# Altium footprint library self_pcblib v1.8.6.PcbLib: 164 footprints (part 3 of 11)
Each footprint in its own frame and in the unit in brackets; x right, y up, seen from the top. Pads: shape width x height; smd on the part's side, far side on the other; paste and mask are expansions set on the pad; w line width, h text height; cw(c..) or ccw(c..) is an arc to the next point about the centre after c.
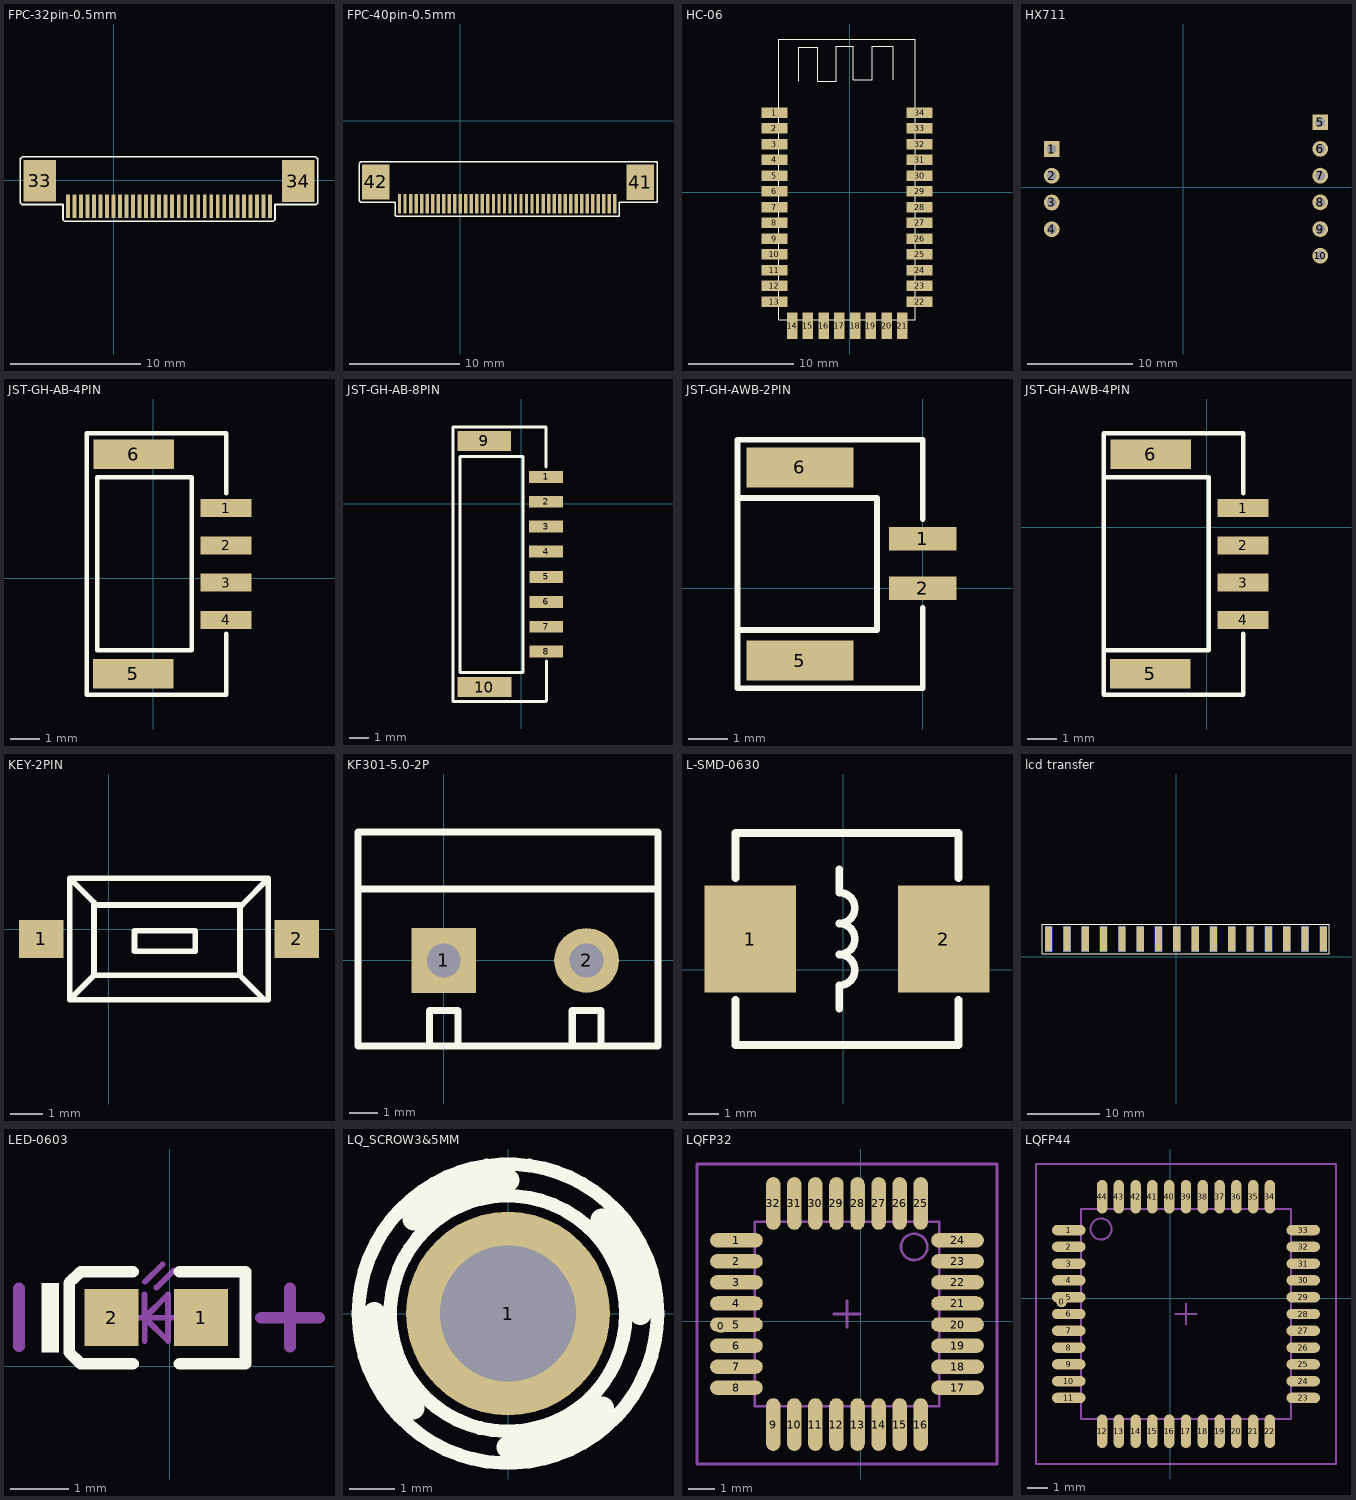
[diagram p2: the footprints below, top view; thin cyan lines are the x and y axes]

## FPC-32pin-0.5mm [mm]
pads (34):
  rect 0.3x1.8 smd: 1(-3.5,-2) 2(-3,-2) 3(-2.5,-2) 4(-2,-2) 5(-1.5,-2) 6(-1,-2) 7(-0.5,-2) 8(0,-2) 9(0.5,-2) 10(1,-2) 11(1.5,-2) 12(2,-2) 13(2.5,-2) 14(3,-2) 15(3.5,-2) 16(4,-2) 17(4.5,-2) 18(5,-2) 19(5.5,-2) 20(6,-2) 21(6.5,-2) 22(7,-2) 23(7.5,-2) 24(8,-2) 25(8.5,-2) 26(9,-2) 27(9.5,-2) 28(10,-2) 29(10.5,-2) 30(11,-2) 31(11.5,-2) 32(12,-2)
  rect 2.5x3.2 smd: 33(-5.664,-0.025) 34(14.173,-0.051)
Top Overlay:
  lines w0.127: -7.163,1.6 -7.163,-1.727 -7.036,-1.854 -3.886,-1.854 -3.886,-3.023 -3.785,-3.124 12.268,-3.124 12.395,-2.997 12.395,-1.854 13.97,-1.854 15.57,-1.854 15.672,-1.753 15.672,1.651 15.519,1.803 -7.01,1.803 -7.163,1.651
3D body "70801.stp": height 2, standoff -0.05, extent -6.5,-2.3 15,3.3

## FPC-40pin-0.5mm [mm]
pads (42):
  rect 0.3x1.8 smd: 1(-5.5,-7.5) 2(-5,-7.5) 3(-4.5,-7.5) 4(-4,-7.5) 5(-3.5,-7.5) 6(-3,-7.5) 7(-2.5,-7.5) 8(-2,-7.5) 9(-1.5,-7.5) 10(-1,-7.5) 11(-0.5,-7.5) 12(0,-7.5) 13(0.5,-7.5) 14(1,-7.5) 15(1.5,-7.5) 16(2,-7.5) 17(2.5,-7.5) 18(3,-7.5) 19(3.5,-7.5) 20(4,-7.5) 21(4.5,-7.5) 22(5,-7.5) 23(5.5,-7.5) 24(6,-7.5) 25(6.5,-7.5) 26(7,-7.5) 27(7.5,-7.5) 28(8,-7.5) 29(8.5,-7.5) 30(9,-7.5) 31(9.5,-7.5) 32(10,-7.5) 33(10.5,-7.5) 34(11,-7.5) 35(11.5,-7.5) 36(12,-7.5) 37(12.5,-7.5) 38(13,-7.5) 39(13.5,-7.5) 40(14,-7.5)
  rect 2.5x3.2 smd: 41(16.307,-5.537) 42(-7.664,-5.525)
Top Overlay:
  lines w0.127: -9.163,-3.9 -9.163,-7.227 -9.036,-7.354 -5.886,-7.354 -5.886,-8.523 -5.785,-8.624 14.376,-8.624 14.376,-7.354 17.831,-7.354 17.831,-3.697 -9.01,-3.697 -9.163,-3.849
3D body "4-1734592-0.stp": height 2, standoff -0.05, extent -8.448,-8.001 16.982,-2.891

## HC-06 [mm]
pads (34):
  rect 2.5x1 smd: 1(-7.171,7.604) 2(-7.171,6.104) 3(-7.171,4.604) 4(-7.171,3.104) 5(-7.171,1.604) 6(-7.171,0.104) 7(-7.171,-1.396) 8(-7.171,-2.896) 9(-7.171,-4.396) 10(-7.171,-5.896) 11(-7.171,-7.396) 12(-7.171,-8.896) 13(-7.171,-10.396) 22(6.629,-10.396) 23(6.629,-8.896) 24(6.629,-7.396) 25(6.629,-5.896) 26(6.629,-4.396) 27(6.629,-2.896) 28(6.629,-1.396) 29(6.629,0.104) 30(6.629,1.604) 31(6.629,3.104) 32(6.629,4.604) 33(6.629,6.104) 34(6.629,7.604)
  rect 1x2.5 smd: 14(-5.496,-12.696) 15(-3.996,-12.696) 16(-2.496,-12.696) 17(-0.996,-12.696) 18(0.504,-12.696) 19(2.004,-12.696) 20(3.504,-12.696) 21(5.004,-12.696)
Top Overlay:
  lines w0.1: -4.871,10.604 -4.871,13.804 -3.071,13.804 -3.071,10.604 -1.271,10.604 -1.271,13.904 0.329,13.904 0.329,10.704 2.129,10.704 2.129,13.904 4.129,13.904 4.129,10.704 ; -6.771,-12.096 6.229,-12.096 6.229,14.604 -6.771,14.604 -6.771,-12.096
3D body "Bluetooth HC-06_.step": height 0, standoff -2.35, extent -7.271,-12.201 6.749,15.809

## HX711 [mm]
pads (10):
  rect 1.5x1.5 hole 0.9: 1(-12.5,3.61) 5(13,6.16)
  round 1.5 hole 0.9: 2(-12.5,1.07) 3(-12.5,-1.47) 4(-12.5,-4.01) 6(13,3.62) 7(13,1.08) 8(13,-1.46) 9(13,-4) 10(13,-6.54)
Bottom Overlay:
  lines w0.127: -14,-8.69 14.5,-8.69 14.5,8.31 -14,8.31 -14,-8.69

## JST-GH-AB-4PIN [mm] "立贴"
pads (6):
  rect 1.7x0.6 smd: 1(2.444,2.352) 2(2.444,1.102) 3(2.444,-0.148) 4(2.444,-1.398)
  rect 2.7x1 smd: 5(-0.66,-3.2) 6(-0.656,4.152)
Top Overlay:
  lines w0.15: 2.444,-1.854 2.444,-3.912 -2.231,-3.912 -2.231,4.852 2.444,4.852 2.444,2.852 ; -1.878,-2.413 1.294,-2.413 1.294,3.377 -1.878,3.377 -1.878,-2.413

## JST-GH-AB-8PIN [mm] "立贴"
pads (10):
  rect 1.7x0.6 smd: 1(1.237,1.348) 2(1.237,0.098) 3(1.237,-1.152) 4(1.237,-2.402) 5(1.249,-3.669) 6(1.249,-4.919) 7(1.249,-6.169) 8(1.249,-7.419)
  rect 2.7x1 smd: 9(-1.863,3.148) 10(-1.854,-9.195)
Top Overlay:
  lines w0.15: 1.237,-9.906 -3.438,-9.906 -3.438,3.848 1.237,3.848 1.237,1.848 ; 1.27,-9.887 1.27,-7.887 ; -3.085,-8.458 -3.085,2.373 0.087,2.373 0.087,-8.458 -3.085,-8.458

## JST-GH-AWB-2PIN [mm] "卧贴"
pads (4):
  rect 1.7x0.6 smd: 1(0,1.25) 2(0,0)
  rect 2.7x1 smd: 5(-3.1,-1.825) 6(-3.1,3.05)
Top Overlay:
  lines w0.15: -4.675,2.275 -1.15,2.275 -1.15,-1.05 -2.019,-1.05 -3.756,-1.05 -4.625,-1.05 ; 0,-0.5 0,-2.525 -4.675,-2.525 -4.675,3.75 0,3.75 0,1.75

## JST-GH-AWB-4PIN [mm] "卧贴"
pads (6):
  rect 1.7x0.6 smd: 1(1.225,0.65) 2(1.225,-0.6) 3(1.225,-1.85) 4(1.225,-3.1)
  rect 2.7x1 smd: 5(-1.88,-4.902) 6(-1.875,2.45)
Top Overlay:
  lines w0.15: -3.45,1.675 0.075,1.675 0.075,-4.115 -3.426,-4.115 ; 1.225,-3.556 1.225,-5.613 -3.45,-5.613 -3.45,3.15 1.225,3.15 1.225,1.15
3D body "User Library-SM04B-GHS-TB.STEP": height 4.25, standoff -0.1, extent -3.314,-5.359 1.536,2.891

## KEY-2PIN [mm]
pads (2):
  rect 1.4x1.2 smd: 1(-2.119,-0.305) 2(5.881,-0.305)
Top Overlay:
  lines w0.178: -0.468,0.838 -0.468,-1.443 ; 4.104,0.699 4.104,-1.448 ; 4.993,1.595 -1.23,1.595 ; -1.23,-2.205 -0.468,-1.443 ; -1.23,-2.205 4.993,-2.205 ; -1.23,-2.205 -1.23,1.595 ; -1.23,1.595 -1.225,1.595 -0.392,0.762 4.167,0.762 4.993,1.588 4.993,-2.205 ; -0.468,-1.443 4.099,-1.443 4.104,-1.448 ; 4.104,-1.448 4.861,-2.205 4.993,-2.205 ; 0.802,-0.686 2.707,-0.686 2.707,-0.051 0.802,-0.051 0.802,-0.686
3D body "按键.STEP": height 1.9, standoff 0, extent -1.42,-1.905 5.18,1.295

## KF301-5.0-2P [mm] "可拼接端子/6A"
pads (2):
  rect 2.3x2.3 hole 1.2: 1(0,0)
  round 2.3 hole 1.2: 2(5.08,0)
Top Overlay:
  lines w0.254: -3.048,2.54 7.62,2.54 ; -0.508,-3.048 -0.508,-1.778 0.508,-1.778 0.508,-3.048 ; 4.572,-3.048 4.572,-1.778 5.588,-1.778 5.588,-3.048 ; -3.048,-3.048 7.62,-3.048 7.62,4.572 -3.048,4.572 -3.048,-3.048
3D body "KF301-5.0.STEP": height 10.05, standoff -3.75, extent 2.003,-3.089 7.503,4.511
3D body "KF301-5.0.STEP": height 10.05, standoff -3.75, extent -2.997,-3.089 2.503,4.511

## L-SMD-0630 [mm] "电感"
pads (2):
  rect 3x3.5 smd: 1(-3.048,1.016) 2(3.302,1.016)
Top Overlay:
  lines w0.254: -3.531,-0.991 -3.531,-2.464 3.785,-2.464 3.785,-0.991 ; -3.531,3.023 -3.531,4.496 3.785,4.496 3.785,3.023 ; -0.127,-1.27 -0.127,-0.508 ccw(c-0.127,0) -0.127,0.508 ccw(c-0.127,1.016) -0.127,1.524 ccw(c-0.127,2.032) -0.127,2.54 -0.127,3.302
3D body "SMD-0630.STEP": height 3.05, standoff 0.02, extent -3.348,-2.284 3.602,4.316

## lcd transfer [mm]
pads (32):
  rect 1x3.5 smd far side: 1(-17.729,2.489) 3(-15.189,2.489) 5(-12.649,2.489) 7(-10.109,2.489) 9(-7.569,2.489) 11(-5.029,2.489) 13(-2.489,2.489) 15(0.051,2.489) 17(2.591,2.489) 19(5.131,2.489) 21(7.671,2.489) 23(10.211,2.489) 25(12.751,2.489) 27(15.291,2.489) 29(17.831,2.489) 31(20.371,2.489)
  rect 1x3.5 smd: 2(-17.729,2.489) 4(-15.189,2.489) 6(-12.649,2.489) 8(-10.109,2.489) 10(-7.569,2.489) 12(-5.029,2.489) 14(-2.489,2.489) 16(0.051,2.489) 18(2.591,2.489) 20(5.131,2.489) 22(7.671,2.489) 24(10.211,2.489) 26(12.751,2.489) 28(15.291,2.489) 30(17.831,2.489) 32(20.371,2.489)
Top Overlay:
  lines w0.127: -18.593,0.432 21.184,0.432 21.184,4.547 -18.593,4.547 -18.593,0.432

## LED-0603 [mm]
pads (2):
  rect 0.93x0.98 smd: 1(0.541,0.838) 2(-0.999,0.838)
Top Overlay:
  rectangle: -2.204,0.238 -1.904,1.438
  lines w0.2: -0.629,0.048 -1.529,0.048 -1.729,0.241 -1.729,1.435 -1.529,1.628 -0.629,1.628 ; 0.171,0.048 1.306,0.048 1.306,1.628 0.171,1.628
Mechanical 13:
  lines w0.1: -0.629,0.838 0.171,0.838 ; -0.429,0.438 -0.429,1.238 ; -0.424,1.455 -0.124,1.755 ; -0.224,1.355 0.076,1.655 ; -0.429,0.838 -0.029,1.238 -0.029,0.438 -0.429,0.838
Mechanical 15:
  lines w0.203: -2.591,0.346 -2.591,1.346 ; 1.571,0.838 2.571,0.838 ; 2.071,0.338 2.071,1.338
3D body "User Library-LED_0603_R.STEP": height 0.6, standoff 0, extent -1.028,0.438 0.572,1.238

## LQ_SCROW3&5MM [mm]
pads (1):
  round 4.5 hole 3: 1(0,0)
Top Overlay:
  circle w0.3: c0,0 r2.6
  circle w0.3: c0,0 r3.3
  lines w0.5: -2.952,0 ccw(c0,0) -2.088,-2.088 ; -2.081,2.081 cw(c0,0) 0,2.943 ; 0,-2.95 ccw(c0,0) 2.086,-2.086 ; 2.066,2.066 cw(c0,0) 2.922,0
Bottom Overlay:
  circle w0.3: c0,-0.02 r3.3
  circle w0.3: c0,-0.02 r2.6
  lines w0.5: -2.952,-0.02 ccw(c0,-0.02) -2.088,-2.108 ; -2.081,2.061 cw(c0,-0.02) 0,2.923 ; 0,-2.97 ccw(c0,-0.02) 2.086,-2.106 ; 2.066,2.046 cw(c0,-0.02) 2.922,-0.02
3D body "LQ_SCREW3X5.stp": height 1.3, standoff -8.1, extent -3,-3 3,3

## LQFP32 [mm]
pads (33):
  round 0.508 smd: 0(-5.309,-0.178)
  oval 2x0.55 smd: 1(-4.723,3.082) 2(-4.723,2.282) 3(-4.723,1.482) 4(-4.723,0.682) 5(-4.723,-0.118) 6(-4.723,-0.918) 7(-4.723,-1.718) 8(-4.723,-2.518) 17(3.677,-2.518) 18(3.677,-1.718) 19(3.677,-0.918) 20(3.677,-0.118) 21(3.677,0.682) 22(3.677,1.482) 23(3.677,2.282) 24(3.677,3.082)
  oval 0.55x2 smd: 9(-3.323,-3.918) 10(-2.523,-3.918) 11(-1.723,-3.918) 12(-0.923,-3.918) 13(-0.123,-3.918) 14(0.677,-3.918) 15(1.477,-3.918) 16(2.277,-3.918) 25(2.277,4.482) 26(1.477,4.482) 27(0.677,4.482) 28(-0.123,4.482) 29(-0.923,4.482) 30(-1.723,4.482) 31(-2.523,4.482) 32(-3.323,4.482)
Mechanical 13:
  circle w0.1: c2.027,2.832 r0.5
  lines w0.1: -4.023,-3.218 -4.023,3.782 2.977,3.782 2.977,-3.218 -4.023,-3.218
Mechanical 15:
  lines w0.1: -1.023,0.282 -0.023,0.282 ; -0.523,-0.218 -0.523,0.782 ; -6.223,-5.418 -6.223,5.982 5.177,5.982 5.177,-5.418 -6.223,-5.418
3D body "LQFP32.STEP": height 1.63, standoff -0.09, extent -4.998,-4.214 4.002,4.786

## LQFP44 [mm]
pads (45):
  round 0.508 smd: 0(-5.182,-0.178)
  oval 1.6x0.5 smd: 1(-4.836,3.248) 2(-4.836,2.448) 3(-4.836,1.648) 4(-4.836,0.848) 5(-4.836,0.048) 6(-4.836,-0.752) 7(-4.836,-1.552) 8(-4.836,-2.352) 9(-4.836,-3.152) 10(-4.836,-3.952) 11(-4.836,-4.752) 23(6.334,-4.752) 24(6.334,-3.952) 25(6.334,-3.152) 26(6.334,-2.352) 27(6.334,-1.552) 28(6.334,-0.752) 29(6.334,0.048) 30(6.334,0.848) 31(6.334,1.648) 32(6.334,2.448) 33(6.334,3.248)
  oval 0.5x1.6 smd: 12(-3.251,-6.337) 13(-2.451,-6.337) 14(-1.651,-6.337) 15(-0.851,-6.337) 16(-0.051,-6.337) 17(0.749,-6.337) 18(1.549,-6.337) 19(2.349,-6.337) 20(3.149,-6.337) 21(3.949,-6.337) 22(4.749,-6.337) 34(4.749,4.833) 35(3.949,4.833) 36(3.149,4.833) 37(2.349,4.833) 38(1.549,4.833) 39(0.749,4.833) 40(-0.051,4.833) 41(-0.851,4.833) 42(-1.651,4.833) 43(-2.451,4.833) 44(-3.251,4.833)
Mechanical 13:
  circle w0.1: c-3.301,3.298 r0.5
  lines w0.1: -4.251,-5.752 -4.251,4.248 5.749,4.248 5.749,-5.752 -4.251,-5.752
Mechanical 15:
  lines w0.1: 0.249,-0.752 1.249,-0.752 ; 0.749,-1.252 0.749,-0.252 ; -6.401,-7.902 -6.401,6.398 7.899,6.398 7.899,-7.902 -6.401,-7.902
3D body "LQFP44.step": height 1.5, standoff 0.02, extent -5.22,-6.757 6.78,5.243